# Altium footprint library THU VIEN PCB.PCBLib: 911 footprints (part 33 of 57)
Each footprint in its own frame and in the unit in brackets; x right, y up, seen from the top. Pads: shape width x height; smd on the part's side, far side on the other; paste and mask are expansions set on the pad; w line width, h text height; cw(c..) or ccw(c..) is an arc to the next point about the centre after c.
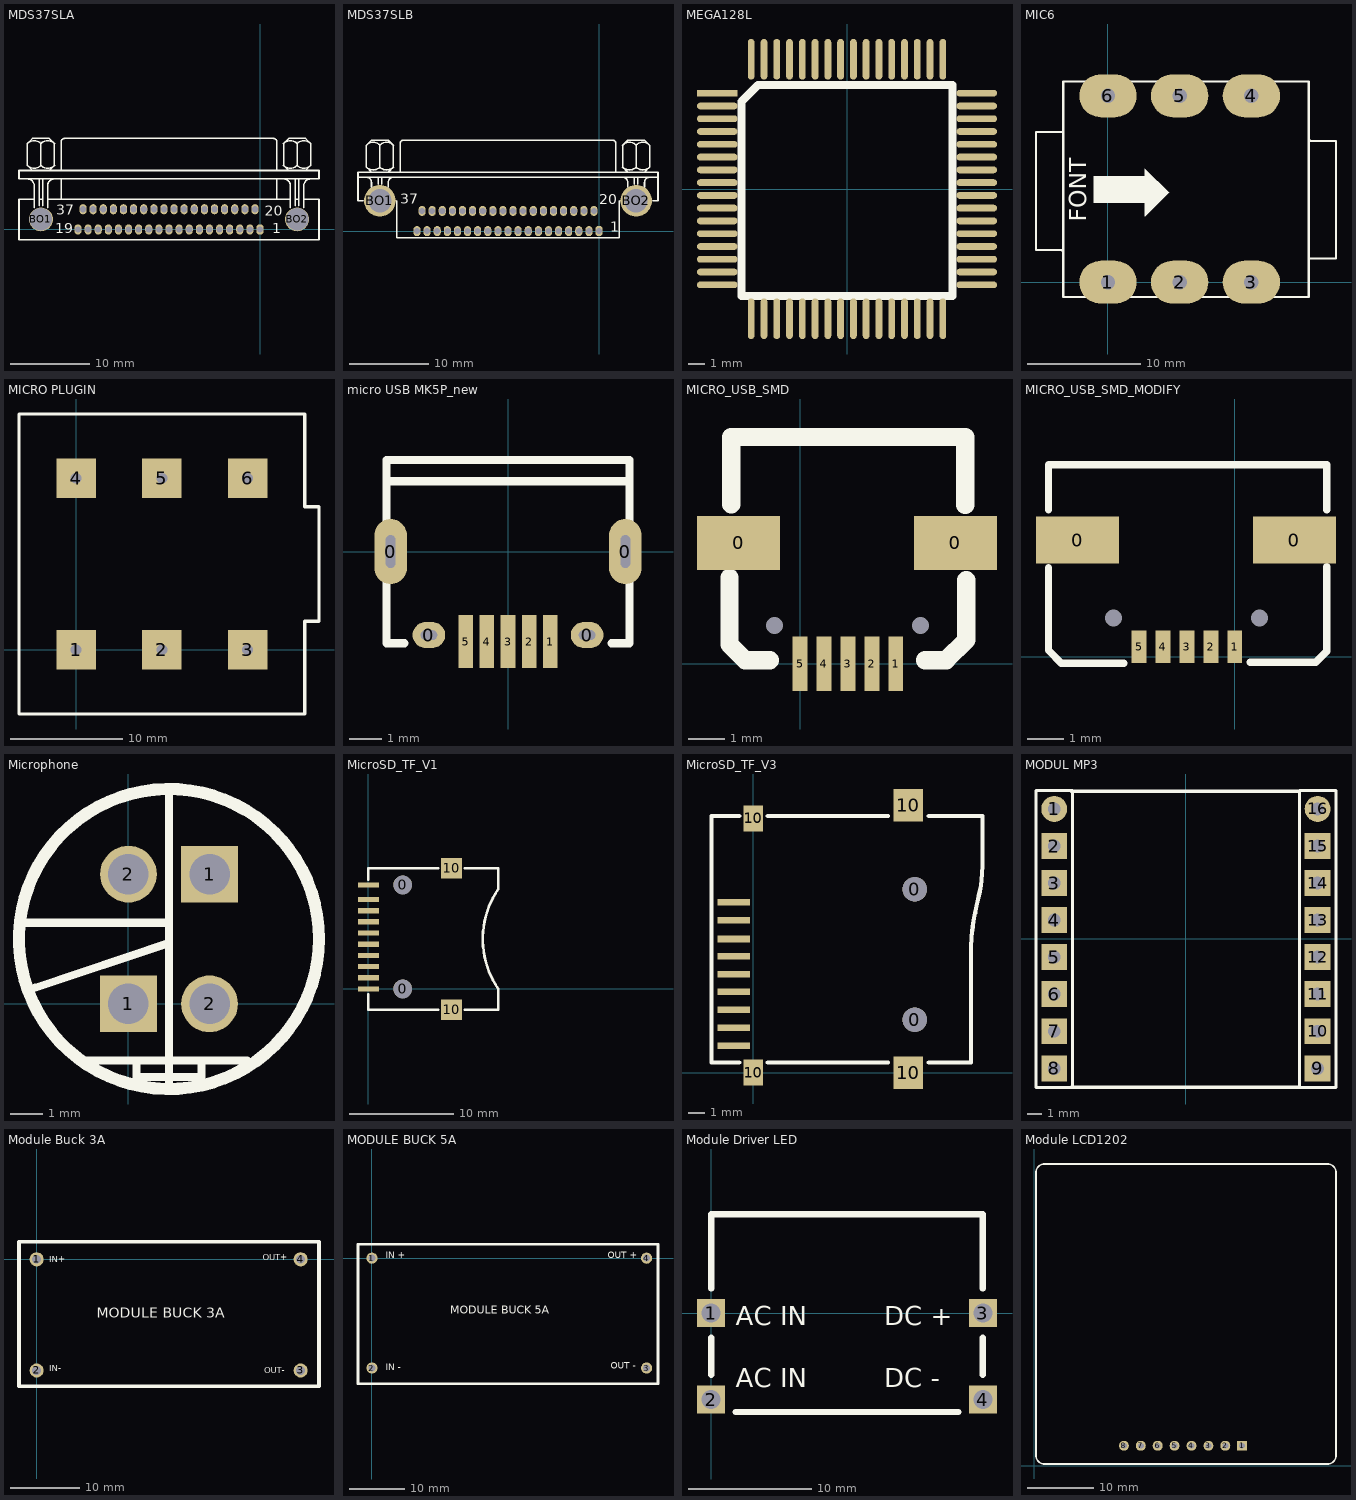
[diagram p32: the footprints below, top view; thin cyan lines are the x and y axes]

## MDS37SLA [mil]
pads (39):
  oct 35x50 hole 30: 1(0,0)
  oval 35x50 hole 30: 2(-50,0) 3(-100,0) 4(-150,0) 5(-200,0) 6(-250,0) 7(-300,0) 8(-350,0) 9(-400,0) 10(-450,0) 11(-500,0) 12(-550,0) 13(-600,0) 14(-650,0) 15(-700,0) 16(-750,0) 17(-800,0) 18(-850,0) 19(-900,0) 20(-25,100) 21(-75,100) 22(-125,100) 23(-175,100) 24(-225,100) 25(-275,100) 26(-325,100) 27(-375,100) 28(-425,100) 29(-475,100) 30(-525,100) 31(-575,100) 32(-625,100) 33(-675,100) 34(-725,100) 35(-775,100) 36(-825,100) 37(-875,100)
  round 118.33 hole 110.83: BO1(-1083.33,50) BO2(183.33,50)
Top Overlay:
  lines w8: -1150.25,316.41 ccw(c-1116.67,350) -1083.08,316.41 ; -1150.25,425.25 cw(c-1116.67,391.67) -1083.08,425.25 ; -1150,250 cw(c-1150,216.67) -1116.67,216.67 -1116.67,108.33 ; -1125,291.67 -1150,316.67 -1150,425 -1125,450 -1041.67,450 -1016.67,425 -1016.67,316.67 -1041.67,291.67 ; -1116.67,150 -1191.67,150 -1191.67,-50 291.67,-50 291.67,150 216.67,150 ; -1091.67,116.67 -1091.67,250 ; -1091.67,150 -1075,150 ; -1083.59,316.41 ccw(c-1050,350) -1016.41,316.41 ; -1083.59,425.25 cw(c-1050,391.67) -1016.41,425.25 ; -1083.33,316.67 -1083.33,425 ; -1075,116.67 -1075,250 ; -1050,108.33 -1050,216.67 cw(c-1016.67,216.67) -1016.67,250 ; -1050,150 150,150 ; -983.33,150 -983.33,250 ; -983.33,291.67 -983.33,433.33 cw(c-966.67,433.33) -966.67,450 66.67,450 cw(c66.67,433.33) 83.33,433.33 83.33,291.67 ; 83.33,150 83.33,250 ; 116.41,316.41 ccw(c150,350) 183.59,316.41 ; 116.41,425.25 cw(c150,391.67) 183.59,425.25 ; 116.67,250 cw(c116.67,216.67) 150,216.67 150,108.33 ; 141.67,291.67 116.67,316.67 116.67,425 141.67,450 225,450 250,425 250,316.67 225,291.67 ; 175,116.67 175,250 ; 175,150 191.67,150 ; 183.08,316.41 ccw(c216.67,350) 250.25,316.41 ; 183.08,425.25 cw(c216.67,391.67) 250.25,425.25 ; 183.33,316.67 183.33,425 ; 191.67,116.67 191.67,250 ; 216.67,108.33 216.67,216.67 cw(c250,216.67) 250,250 ; -1191.67,250 -1191.67,291.67 291.67,291.67 291.67,250 -1191.67,250
  text "1" at 60,-20 h50
  text "19" at -1012.73,-18.18 h50
  text "37" at -1006.58,73.44 h50
  text "20" at 23.98,68.07 h50

## MDS37SLB [mil]
pads (39):
  oct 35x50 hole 30: 1(0,0)
  oval 35x50 hole 30: 2(-50,0) 3(-100,0) 4(-150,0) 5(-200,0) 6(-250,0) 7(-300,0) 8(-350,0) 9(-400,0) 10(-450,0) 11(-500,0) 12(-550,0) 13(-600,0) 14(-650,0) 15(-700,0) 16(-750,0) 17(-800,0) 18(-850,0) 19(-900,0) 20(-25,100) 21(-75,100) 22(-125,100) 23(-175,100) 24(-225,100) 25(-275,100) 26(-325,100) 27(-375,100) 28(-425,100) 29(-475,100) 30(-525,100) 31(-575,100) 32(-625,100) 33(-675,100) 34(-725,100) 35(-775,100) 36(-825,100) 37(-875,100)
  round 156.67 hole 115: BO1(-1083.33,150) BO2(183.33,150)
Top Overlay:
  lines w8: -1166.67,150 -1191.67,150 -1191.67,266.67 ; -1150.25,316.41 ccw(c-1116.67,350) -1083.08,316.41 ; -1150.25,425.25 cw(c-1116.67,391.67) -1083.08,425.25 ; -1150,266.67 cw(c-1150,241.67) -1125,241.67 -1125,216.67 ; -1125,291.67 -1150,316.67 -1150,425 -1125,450 -1041.67,450 -1016.67,425 -1016.67,316.67 -1041.67,291.67 ; -1091.67,233.33 -1091.67,266.67 ; -1083.59,316.41 ccw(c-1050,350) -1016.41,316.41 ; -1083.59,425.25 cw(c-1050,391.67) -1016.41,425.25 ; -1083.33,316.67 -1083.33,425 ; -1075,233.33 -1075,266.67 ; -1041.67,216.67 -1041.67,241.67 cw(c-1016.67,241.67) -1016.67,266.67 ; -1000,150 -1000,-33.33 100,-33.33 100,150 ; -983.33,291.67 -983.33,433.33 cw(c-966.67,433.33) -966.67,450 66.67,450 cw(c66.67,433.33) 83.33,433.33 83.33,291.67 ; 116.41,316.41 ccw(c150,350) 183.59,316.41 ; 116.41,425.25 cw(c150,391.67) 183.59,425.25 ; 116.67,266.67 cw(c116.67,241.67) 141.67,241.67 141.67,216.67 ; 141.67,291.67 116.67,316.67 116.67,425 141.67,450 225,450 250,425 250,316.67 225,291.67 ; 175,233.33 175,266.67 ; 183.08,316.41 ccw(c216.67,350) 250.25,316.41 ; 183.08,425.25 cw(c216.67,391.67) 250.25,425.25 ; 183.33,316.67 183.33,425 ; 191.67,233.33 191.67,266.67 ; 225,216.67 225,241.67 cw(c250,241.67) 250,266.67 ; 266.67,150 291.67,150 291.67,266.67 ; -1191.67,266.67 -1191.67,291.67 291.67,291.67 291.67,266.67 ; -1191.67,266.67 291.67,266.67
  text "1" at 56.69,-2.62 h50
  text "20" at 1.59,133.35 h50
  text "37" at -982.06,136.6 h50

## MEGA128L [mm]
pads (64):
  rect 2.54x0.432 smd: 1(-8.125,6)
  oval 2.54x0.432 smd: 2(-8.125,5.2) 3(-8.125,4.4) 4(-8.125,3.6) 5(-8.125,2.8) 6(-8.125,2) 7(-8.125,1.2) 8(-8.125,0.4) 9(-8.125,-0.4) 10(-8.125,-1.2) 11(-8.125,-2) 12(-8.125,-2.8) 13(-8.125,-3.6) 14(-8.125,-4.4) 15(-8.125,-5.2) 16(-8.125,-6) 33(8.125,-6) 34(8.125,-5.2) 35(8.125,-4.4) 36(8.125,-3.6) 37(8.125,-2.8) 38(8.125,-2) 39(8.125,-1.2) 40(8.125,-0.4) 41(8.125,0.4) 42(8.125,1.2) 43(8.125,2) 44(8.125,2.8) 45(8.125,3.6) 46(8.125,4.4) 47(8.125,5.2) 48(8.125,6)
  oval 0.432x2.54 smd: 17(-6,-8.125) 18(-5.2,-8.125) 19(-4.4,-8.125) 20(-3.6,-8.125) 21(-2.8,-8.125) 22(-2,-8.125) 23(-1.2,-8.125) 24(-0.4,-8.125) 25(0.4,-8.125) 26(1.2,-8.125) 27(2,-8.125) 28(2.8,-8.125) 29(3.6,-8.125) 30(4.4,-8.125) 31(5.2,-8.125) 32(6,-8.125) 49(6,8.125) 50(5.2,8.125) 51(4.4,8.125) 52(3.6,8.125) 53(2.8,8.125) 54(2,8.125) 55(1.2,8.125) 56(0.4,8.125) 57(-0.4,8.125) 58(-1.2,8.125) 59(-2,8.125) 60(-2.8,8.125) 61(-3.6,8.125) 62(-4.4,8.125) 63(-5.2,8.125) 64(-6,8.125)
Top Overlay:
  lines w0.508: -6.601,-6.7 6.607,-6.7 6.607,6.508 -5.585,6.508 -6.601,5.492 -6.601,-6.7

## MIC6 [mil] "Jac Mic 6 pin to"
pads (6):
  oval 200x150 hole 50: 1(0,0) 2(250,0) 3(500,0) 4(500,650) 5(250,650) 6(0,650)
Top Overlay:
  region: -50,369 -50,277 130,277 129,278 129,230 130,230 212,312 213,312 129,396 129,369
  lines w7: -156,-51 -156,699 ; -156,89 -156,525 -158,523 -251,523 -251,112 -162,112 -156,106 ; -156,700 700,700 700,590 ; -155,-52 -154,-51 -153,-52 700,-52 700,82 ; 700,499 706,493 795,493 795,82 702,82 700,80 700,594
  text "FONT" at -75,210 h60

## MICRO PLUGIN [mil]
pads (6):
  rect 137.8x137.8 / inner round 62 / far side rect 137.8x137.8 hole 38: 1(0,0) 2(300,0) 3(600,0) 4(0,600) 5(300,600) 6(600,600)
Top Overlay:
  lines w11.82: -200,-225 -200,825 800,825 800,500 850,500 850,100 800,100 800,-225 -200,-225

## micro USB MK5P_new [mm]
pads (9):
  oval 1x2 hole 1 slot 0.3 at 0 deg: 0(-3.6,0) 0(3.6,0)
  oval 1x0.8 hole 0.3 slot 0.5 at 0 deg: 0(-2.425,-2.56) 0(2.425,-2.56)
  rect 0.45x1.622 smd: 1(1.3,-2.76)
  rect 0.45x1.62 smd: 2(0.65,-2.76) 3(0,-2.76) 4(-0.65,-2.76) 5(-1.3,-2.76)
Top Overlay:
  lines w0.254: -3.725,-2.81 -3.725,2.81 3.725,2.81 3.725,-2.81 ; -3.725,2.16 3.725,2.16 ; -3.683,-2.81 -3.175,-2.81 ; 3.175,-2.81 3.683,-2.81
3D body "User Library-MicroUSB-B_Molex_105017-0001.step": height 2.71, standoff -0.59, extent -4.1,-2.65 4.1,2.78

## MICRO_USB_SMD [mm] "QFN, 14-Leads, Body 4.00x4.00mm, Pitch 0.50mm, Thermal Pad 4.00x2.20mm, IPC Medium Density"
height 0.8
pads (9):
  rect 2.3x1.5 smd: 0(-1.7,3.346) 0(4.3,3.346)
  rect 0.41x1.5 smd: 1(2.65,0) 2(1.987,0) 3(1.325,0) 4(0.662,0) 5(0,0)
  round 0 hole 0.47: 6(-0.7,1.067) 7(3.339,1.067)
Top Overlay:
  lines w0.508: -1.952,2.388 -1.952,0.533 -1.52,0.102 -0.838,0.102 ; -1.901,4.42 -1.901,6.274 4.576,6.274 4.576,4.394 ; 3.459,0.102 4.043,0.102 4.602,0.66 4.602,2.311
3D body "2174507-2.stp": height 2.68, standoff -0.02, extent -2.503,0.334 5.297,5.334

## MICRO_USB_SMD_MODIFY [mm]
pads (9):
  rect 2.3x1.3 smd: 0(-4.35,3.226) 0(1.65,3.226)
  rect 0.41x0.9 smd: 1(0,0.279) 2(-0.662,0.279) 3(-1.325,0.279) 4(-1.987,0.279) 5(-2.65,0.279)
  round 0 hole 0.47: 6(-3.35,1.067) 7(0.689,1.067)
Top Overlay:
  lines w0.203: -5.156,2.464 -5.156,0.178 -4.801,-0.178 -3.073,-0.178 ; -5.156,4.064 -5.156,5.309 2.54,5.309 2.54,4.064 ; 0.432,-0.152 2.235,-0.152 2.54,0.152 2.54,2.489
3D body "2174507-2.stp": height 2.68, standoff -0.02, extent -5.153,0.334 2.647,5.334

## Microphone [mil]
pads (4):
  rect 70x70 hole 50: 1(0,0) 1(100,160)
  round 70 hole 50: 2(0,160) 2(100,0)
Top Overlay:
  circle w15: c50,80 r185
  lines w10: -135,100 50,100 ; -115,20 50,75 ; -56.15,-70 146.54,-70 ; 10,-70 10,-90 90,-90 90,-70 ; 50,-105 50,230 ; 50,-70 50,265
3D body "microphone.step": height 202.76, standoff -158.17, extent -140.94,-110.94 240.95,270.94

## MicroSD_TF_V1 [mm]
pads (14):
  round 1.8 hole 1.8: 0(3.3,0) 0(3.3,10)
  rect 2x0.5 smd: 1(0,7.525) 2(0,6.45) 3(0,5.375) 4(0,4.3) 5(0,3.225) 6(0,2.15) 7(0,1.075) 8(0,0) 9(0,8.6) 10(0,10)
  rect 2x2 smd: 10(8,-2) 10(8,11.6)
Top Overlay:
  lines w0.254: 0,-0.5 0,-2 6.7,-2 ; 0,10.5 0,11.6 6.7,11.6 ; 9.3,-2 12.5,-2 12.5,0 cw(c19.43,4.8) 12.5,9.6 12.5,11.6 9.3,11.6

## MicroSD_TF_V3 [mm]
pads (15):
  round 1.5 hole 1.5: 0(9.9,3.25) 0(9.9,11.25)
  rect 2x0.4 smd: 1(-1.2,10.45) 2(-1.2,9.35) 3(-1.2,8.2) 4(-1.2,7.15) 5(-1.2,6.05) 6(-1.2,4.95) 7(-1.2,3.85) 8(-1.2,2.75) 9(-1.2,1.65)
  rect 1.2x1.6 smd: 10(0,0) 10(0,15.6)
  rect 1.8x2 smd: 10(9.5,0) 10(9.5,16.4)
Top Overlay:
  lines w0.254: -0.875,0.625 -2.575,0.625 -2.575,15.75 -0.875,15.75 ; 0.875,0.625 8.25,0.625 ; 0.875,15.75 8.25,15.75 ; 10.75,0.625 13.35,0.625 13.35,7.65 13.375,8.35 13.45,8.975 13.5,9.325 13.6,9.8 13.75,10.5 13.85,10.975 13.95,11.475 14.025,12.175 14.05,12.75 14.05,15.75 10.75,15.75
Bottom Solder:
  circle w0.013: c9.9,11.25 r0.6
  circle w0.013: c9.9,3.25 r0.6
3D body "User Library-MEM2055-00-190-01-A_revG.STEP": height 1.86, standoff -0.59, extent -1.385,0.189 13.865,16.189

## MODUL MP3 [mil]
pads (16):
  round 70 hole 35 unplated: 1(-355.5,350) 16(355.5,350)
  rect 70x70 hole 35 unplated: 2(-355.5,250) 3(-355.5,150) 4(-355.5,50) 5(-355.5,-50) 6(-355.5,-150) 7(-355.5,-250) 8(-355.5,-350) 9(355.5,-350) 10(355.5,-250) 11(355.5,-150) 12(355.5,-50) 13(355.5,50) 14(355.5,150) 15(355.5,250)
Top Overlay:
  lines w5: 355.5,400 356.5,400
  lines w8.66: -309.5,-401 305.5,-401 ; -309.5,398 307.5,398 ; -306.29,-402 -404.71,-402 -404.75,399.5 -306,399.5 ; -306.27,-402 -306,399 ; 404.71,-402 306.29,-402 306.25,399.5 405,399.5 404.73,-402

## Module Buck 3A [mil]
pads (4):
  round 80 hole 50: 1(0,0) 2(0,-629.92) 3(1496.06,-629.92) 4(1496.06,0)
Top Overlay:
  lines w20: -100,-720 1600,-720 1600,100 -100,100 -100,-720
  text "MODULE BUCK 3A" at 340,-350 h100
  text "IN+" at 70,-30 h60
  text "IN-" at 70,-650 h60
  text "OUT-" at 1290,-660 h60
  text "OUT+" at 1280,-20 h60

## MODULE BUCK 5A [mil]
pads (4):
  round 80 hole 50: 1(0,0) 2(0,-787.4) 3(1968.5,-787.4) 4(1968.5,0)
Top Overlay:
  lines w20: -100,-900 -100,100 2050,100 2050,-900 -100,-900
  text "OUT -" at 1710,-810 h80
  text "OUT +" at 1690,-20 h80
  text "IN -" at 100,-820 h80
  text "IN +" at 100,-20 h80
  text "MODULE BUCK 5A" at 560,-420 h100
3D body: height 59.06, standoff 0, extent 1921,-838 2021,-738
3D body: height 275.59, standoff -39.37, extent 1954.32,-804.71 1985.69,-773.28
3D body: height 59.06, standoff 0, extent 1916,-48 2016,52
3D body: height 275.59, standoff -39.37, extent 1949.32,-11.71 1980.69,19.72
3D body: height 59.06, standoff 0, extent -49,-835 51,-735
3D body: height 275.59, standoff -39.37, extent -14.68,-803.72 16.69,-772.28
3D body: height 275.59, standoff -39.37, extent -15.68,-13.71 15.69,17.72
3D body: height 59.06, standoff 0, extent -49,-50 51,50

## Module Driver LED [mil]
pads (4):
  rect 90x90 hole 60: 1(0,0) 2(0,-275.59) 3(866.14,0) 4(866.14,-275.59)
Top Overlay:
  lines w20: 0,-196.85 0,-78.74 ; 0,78.74 0,314.96 78.74,314.96 787.4,314.96 866.14,314.96 866.14,78.74 ; 78.74,-314.96 787.4,-314.96 ; 866.14,-196.85 866.14,-78.74
  text "AC IN" at 78.74,-39.37 h60
  text "AC IN" at 78.74,-236.22 h60
  text "DC +" at 551.18,-39.37 h60
  text "DC -" at 551.18,-236.22 h60

## Module LCD1202 [mm]
pads (8):
  rect 1.5x1.5 hole 0.9: 1(31.267,3.023)
  round 1.5 hole 0.9: 2(28.727,3.023) 3(26.187,3.023) 4(23.647,3.023) 5(21.107,3.023) 6(18.567,3.023) 7(16.027,3.023) 8(13.487,3.023)
Top Overlay:
  lines w0.254: 0.279,1.549 ccw(c1.549,1.549) 1.549,0.279 44.094,0.279 ccw(c44.094,1.549) 45.364,1.549 45.364,44.094 ccw(c44.094,44.094) 44.094,45.364 2.819,45.364 1.549,45.364 ccw(c1.549,44.094) 0.279,44.094 0.279,42.824 0.279,1.549
Bottom Overlay:
  lines w0.2: 12.217,1.753 12.217,4.293 32.537,4.293 32.537,1.753 12.217,1.753
3D body: height 1.5, standoff 0, extent 19.837,1.753 22.377,4.293
3D body: height 7, standoff -1, extent 20.717,2.616 21.514,3.415
3D body: height 1.5, standoff 0, extent 22.377,1.753 24.917,4.293
3D body: height 7, standoff -1, extent 23.257,2.616 24.054,3.415
3D body: height 1.5, standoff 0, extent 24.917,1.753 27.457,4.293
3D body: height 7, standoff -1, extent 25.797,2.616 26.594,3.415
3D body: height 1.5, standoff 0, extent 27.457,1.753 29.997,4.293
3D body: height 7, standoff -1, extent 28.337,2.616 29.134,3.415
3D body: height 1.5, standoff 0, extent 29.997,1.753 32.537,4.293
3D body: height 7, standoff -1, extent 30.877,2.616 31.674,3.415
3D body: height 1.5, standoff 0, extent 12.217,1.753 14.757,4.293
3D body: height 7, standoff -1, extent 13.097,2.616 13.894,3.415
3D body: height 1.5, standoff 0, extent 14.757,1.753 17.297,4.293
3D body: height 7, standoff -1, extent 15.637,2.616 16.434,3.415
3D body: height 1.5, standoff 0, extent 17.297,1.753 19.837,4.293
3D body: height 7, standoff -1, extent 18.177,2.616 18.974,3.415
3D body "lcd1202.stp": height 5.84, standoff 2.54, extent 4.753,1.02 40.753,39.074